# Altium schematic symbol library FPGA_Xilinx_Virtex7.SchLib: 34 symbols (part 11 of 34) (continued)
## XC7VX330T-FFG1157 (continued)
part I pins: A3 MGTHTXN3_118 (io), A4 MGTHTXP3_118 (io), B1 MGTHTXN2_118 (io), B2 MGTHTXP2_118 (io), B5 MGTHRXN3_118 (io), B6 MGTHRXP3_118 (io), C3 MGTHTXN1_118 (io), C4 MGTHTXP1_118 (io), D1 MGTHTXN0_118 (io), D2 MGTHTXP0_118 (io), D5 MGTHRXN2_118 (io), D6 MGTHRXP2_118 (io), E3 MGTHRXN1_118 (io), E4 MGTHRXP1_118 (io), F5 MGTREFCLK0N_118 (io), F6 MGTREFCLK0P_118 (io), G3 MGTHRXN0_118 (io), G4 MGTHRXP0_118 (io), H5 MGTREFCLK1N_118 (io), H6 MGTREFCLK1P_118 (io)
part J pins: AA6 MGTAVCC_G10 (power), AC2 MGTAVTT_G10 (power), AC6 MGTAVCC_G10 (power), AD3 MGTAVTT_G10 (power), AE6 MGTAVCC_G10 (power), AG2 MGTAVTT_G10 (power), AG6 MGTAVCC_G10 (power), AH3 MGTAVTT_G10 (power), AJ6 MGTAVCC_G10 (power), AL2 MGTAVTT_G10 (power), AL6 MGTAVCC_G10 (power), AM3 MGTAVTT_G10 (power), AN6 MGTAVCC_G10 (power), AN7 MGTRREF_115 (power), AP7 MGTAVTTRCAL_115 (power), C2 MGTAVTT_G11 (power), C6 MGTAVCC_G11 (power), D3 MGTAVTT_G11 (power), E6 MGTAVCC_G11 (power), G2 MGTAVTT_G11 (power), G6 MGTAVCC_G11 (power), H3 MGTAVTT_G11 (power), J6 MGTAVCC_G11 (power), L2 MGTAVTT_G11 (power), L6 MGTAVCC_G11 (power), M3 MGTAVTT_G11 (power), N6 MGTVCCAUX_G11 (power), R2 MGTAVTT_G10 (power), R6 MGTVCCAUX_G10 (power), T3 MGTAVTT_G10 (power), U6 MGTAVCC_G10 (power), W2 MGTAVTT_G10 (power), W6 MGTAVCC_G10 (power), Y3 MGTAVTT_G10 (power)
part K pins: AB8 M1_0 (io), AB9 VCCO_0 (power), AC8 M0_0 (io), L8 TDI_0 (io), M8 TCK_0 (io), N8 TDO_0 (io), N9 TMS_0 (io), T8 INIT_B_0 (io), T9 CCLK_0 (io), U8 PROGRAM_B_0 (io), U16 VN_0 (io), U17 VP_0 (io), V8 DONE_0 (io), V9 CFGBVS_0 (io), V16 VREFN_0 (io), V17 VREFP_0 (io), W8 VCCO_0 (power), W16 DXN_0 (io), W17 DXP_0 (io), Y8 M2_0 (io)
part L pins: A1 GND (power), A2 GND (power), A5 GND (power), A6 GND (power), A7 GND (power), A17 GND (power), A27 GND (power), A34 GND (power), AA10 VCCINT (power), AA12 VCCINT (power), AA14 VCCAUX_IO_G2 (power), AA16 VCCINT (power), AA18 VCCBRAM (power), AA20 VCCAUX_IO_G0 (power), AA22 VCCINT (power), AB11 VCCINT (power), AB13 VCCAUX (power), AB15 VCCINT (power), AB17 VCCBRAM (power), AB19 VCCINT (power), AB21 VCCAUX (power), AB23 VCCINT (power), AC14 VCCAUX_IO_G2 (power), AC20 VCCAUX_IO_G0 (power), B3 GND (power), B4 GND (power), B7 GND (power), B14 GND (power), B24 GND (power), C1 GND (power), C5 GND (power), C7 GND (power), C11 GND (power), C21 GND (power), C31 GND (power), D4 GND (power), D7 GND (power), D8 GND (power), D18 GND (power), D28 GND (power), E1 GND (power), E2 GND (power), E5 GND (power), E7 GND (power), E15 GND (power), E25 GND (power), F3 GND (power), F4 GND (power), F7 GND (power), F12 GND (power), F22 GND (power), F32 GND (power), G1 GND (power), G5 GND (power), G7 GND (power), G9 GND (power), G19 GND (power), G29 GND (power), H4 GND (power), H7 GND (power), H16 GND (power), H26 GND (power), J1 GND (power), J2 GND (power), J5 GND (power), J7 GND (power), J13 GND (power), J23 GND (power), J33 GND (power), K3 GND (power), K4 GND (power), K7 GND (power), K10 GND (power), K20 GND (power), K30 GND (power), L1 GND (power), L5 GND (power), L7 GND (power), L17 GND (power), L27 GND (power), M4 GND (power), M7 GND (power), M14 GND (power), M21 VCCINT (power), M22 GND (power), M23 VCCINT (power), M24 GND (power), M34 GND (power), N1 GND (power), N2 GND (power), N5 GND (power), N7 GND (power), N10 VCCINT (power), N11 GND (power), N12 VCCINT (power), N13 GND (power), N14 VCCAUX_IO_G3 (power), N15 GND (power), N16 VCCINT (power), N17 GND (power), N18 VCCBRAM (power), N19 GND (power), N20 VCCAUX_IO_G1 (power), N21 GND (power), N22 VCCINT (power), N31 GND (power), P3 GND (power), P4 GND (power), P7 GND (power), P8 GND (power), P9 VCCBATT_0 (power), P10 GND (power), P11 VCCINT (power), P12 GND (power), P13 VCCINT (power), P14 GND (power), P15 VCCINT (power), P16 GND (power), P17 VCCINT (power), P18 GND (power), P19 VCCINT (power), P20 GND (power), P21 VCCINT (power), P22 GND (power), P28 GND (power), R1 GND (power), R5 GND (power), R9 GND (power), R10 VCCINT (power), R11 GND (power), R12 VCCINT (power), R13 GND (power), R14 VCCAUX_IO_G3 (power), R15 GND (power), R16 VCCINT (power), R17 GND (power), R18 VCCBRAM (power), R20 VCCAUX_IO_G1 (power), R22 VCCINT (power), T11 VCCINT (power), T13 VCCAUX (power), T15 VCCINT (power), T16 GNDADC_0 (power), T17 VCCADC_0 (power), T19 VCCINT (power), T21 VCCAUX (power), T23 VCCINT (power), U10 VCCINT (power), U12 VCCINT (power), U14 VCCAUX_IO_G3 (power), U18 VCCBRAM (power), U20 VCCAUX_IO_G1 (power), U22 VCCINT (power), V11 VCCINT (power), V13 VCCAUX (power), V15 VCCINT (power), V19 VCCINT (power), V21 VCCAUX (power), W10 VCCINT (power), W12 VCCINT (power), W14 VCCAUX_IO_G2 (power), W18 VCCBRAM (power), W20 VCCAUX_IO_G0 (power), W22 VCCINT (power), Y9 VCCINT (power), Y11 VCCINT (power), Y13 VCCAUX (power), Y15 VCCINT (power), Y17 VCCINT (power), Y19 VCCINT (power), Y21 VCCAUX (power), Y23 VCCINT (power)
part M pins: AA1 GND (power), AA2 GND (power), AA5 GND (power), AA7 GND (power), AA8 GND (power), AA9 GND (power), AA11 GND (power), AA13 GND (power), AA15 GND (power), AA17 GND (power), AA19 GND (power), AA21 GND (power), AA27 GND (power), AB3 GND (power), AB4 GND (power), AB7 GND (power), AB10 GND (power), AB12 GND (power), AB14 GND (power), AB16 GND (power), AB18 GND (power), AB20 GND (power), AB22 GND (power), AB24 GND (power), AB34 GND (power), AC1 GND (power), AC5 GND (power), AC7 GND (power), AC11 GND (power), AC13 GND (power), AC21 GND (power), AC31 GND (power), AD4 GND (power), AD7 GND (power), AD8 GND (power), AD18 GND (power), AD28 GND (power), AE1 GND (power), AE2 GND (power), AE5 GND (power), AE7 GND (power), AE15 GND (power), AE25 GND (power), AF3 GND (power), AF4 GND (power), AF7 GND (power), AF12 GND (power), AF22 GND (power), AF32 GND (power), AG1 GND (power), AG5 GND (power), AG7 GND (power), AG9 GND (power), AG19 GND (power), AG29 GND (power), AH4 GND (power), AH7 GND (power), AH16 GND (power), AH26 GND (power), AJ1 GND (power), AJ2 GND (power), AJ5 GND (power), AJ7 GND (power), AJ13 GND (power), AJ23 GND (power), AJ33 GND (power), AK3 GND (power), AK4 GND (power), AK7 GND (power), AK10 GND (power), AK20 GND (power), AK30 GND (power), AL1 GND (power), AL5 GND (power), AL7 GND (power), AL17 GND (power), AL27 GND (power), AM4 GND (power), AM7 GND (power), AM8 GND (power), AM14 GND (power), AM24 GND (power), AM34 GND (power), AN1 GND (power), AN2 GND (power), AN5 GND (power), AN8 GND (power), AN11 GND (power), AN21 GND (power), AN31 GND (power), AP3 GND (power), AP4 GND (power), AP8 GND (power), AP18 GND (power), AP28 GND (power), R19 GND (power), R21 GND (power), R25 GND (power), T4 GND (power), T7 GND (power), T10 GND (power), T12 GND (power), T14 GND (power), T18 GND (power), T20 GND (power), T22 GND (power), T32 GND (power), U1 GND (power), U2 GND (power), U5 GND (power), U7 GND (power), U9 GND (power), U11 GND (power), U13 GND (power), U15 GND (power), U19 GND (power), U21 GND (power), U29 GND (power), V3 GND (power), V4 GND (power), V7 GND (power), V10 GND (power), V12 GND (power), V14 GND (power), V18 GND (power), V20 GND (power), V22 GND (power), V26 GND (power), W1 GND (power), W5 GND (power), W7 GND (power), W9 GND (power), W11 GND (power), W13 GND (power), W15 GND (power), W19 GND (power), W21 GND (power), W23 GND (power), W33 GND (power), Y4 GND (power), Y5 GND (power), Y6 GND (power), Y7 GND (power), Y10 GND (power), Y12 GND (power), Y14 GND (power), Y16 GND (power), Y18 GND (power), Y20 GND (power), Y22 GND (power), Y30 GND (power)

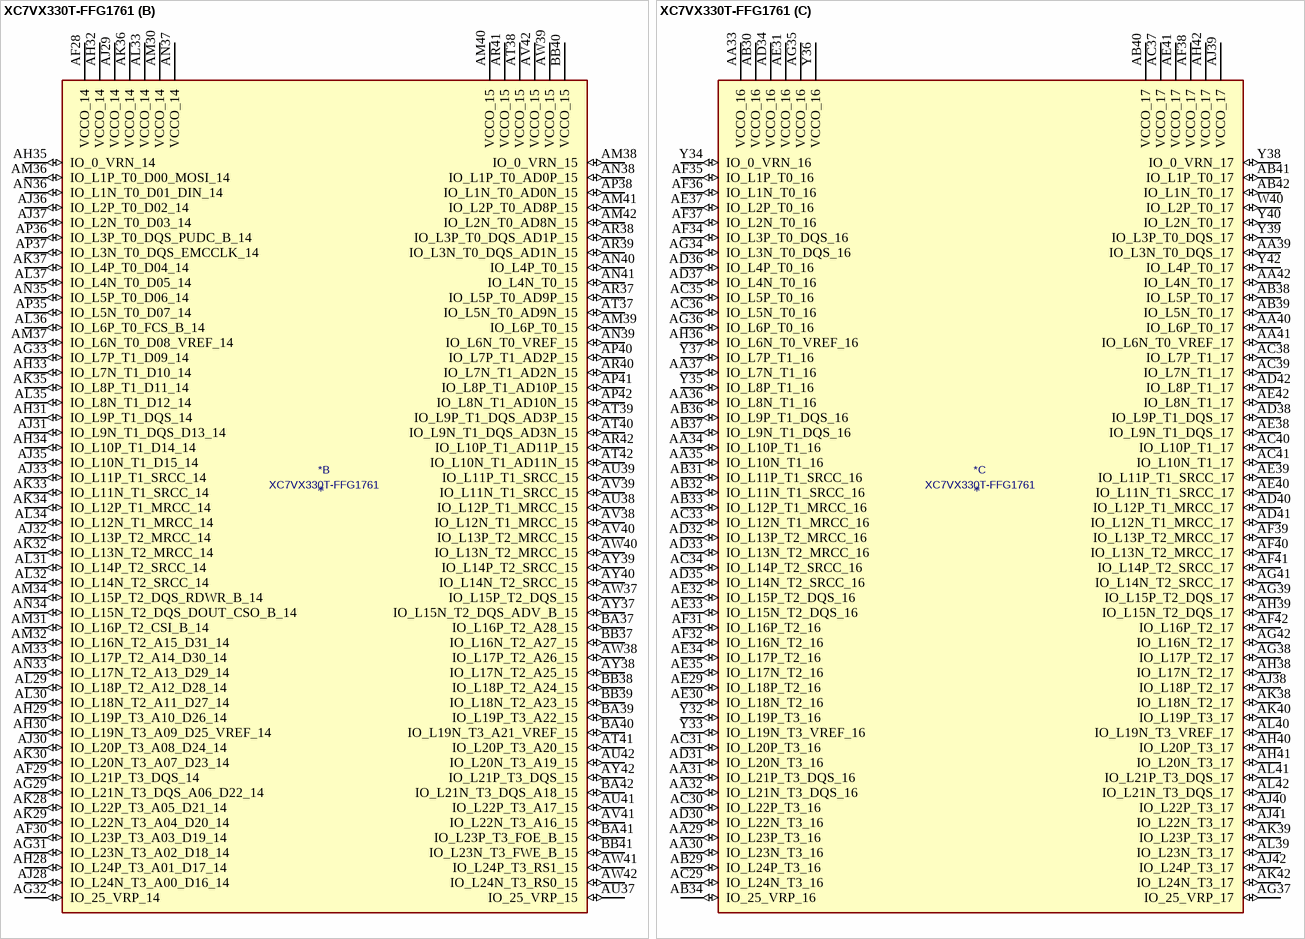
[diagram p55: symbol XC7VX330T-FFG1761]

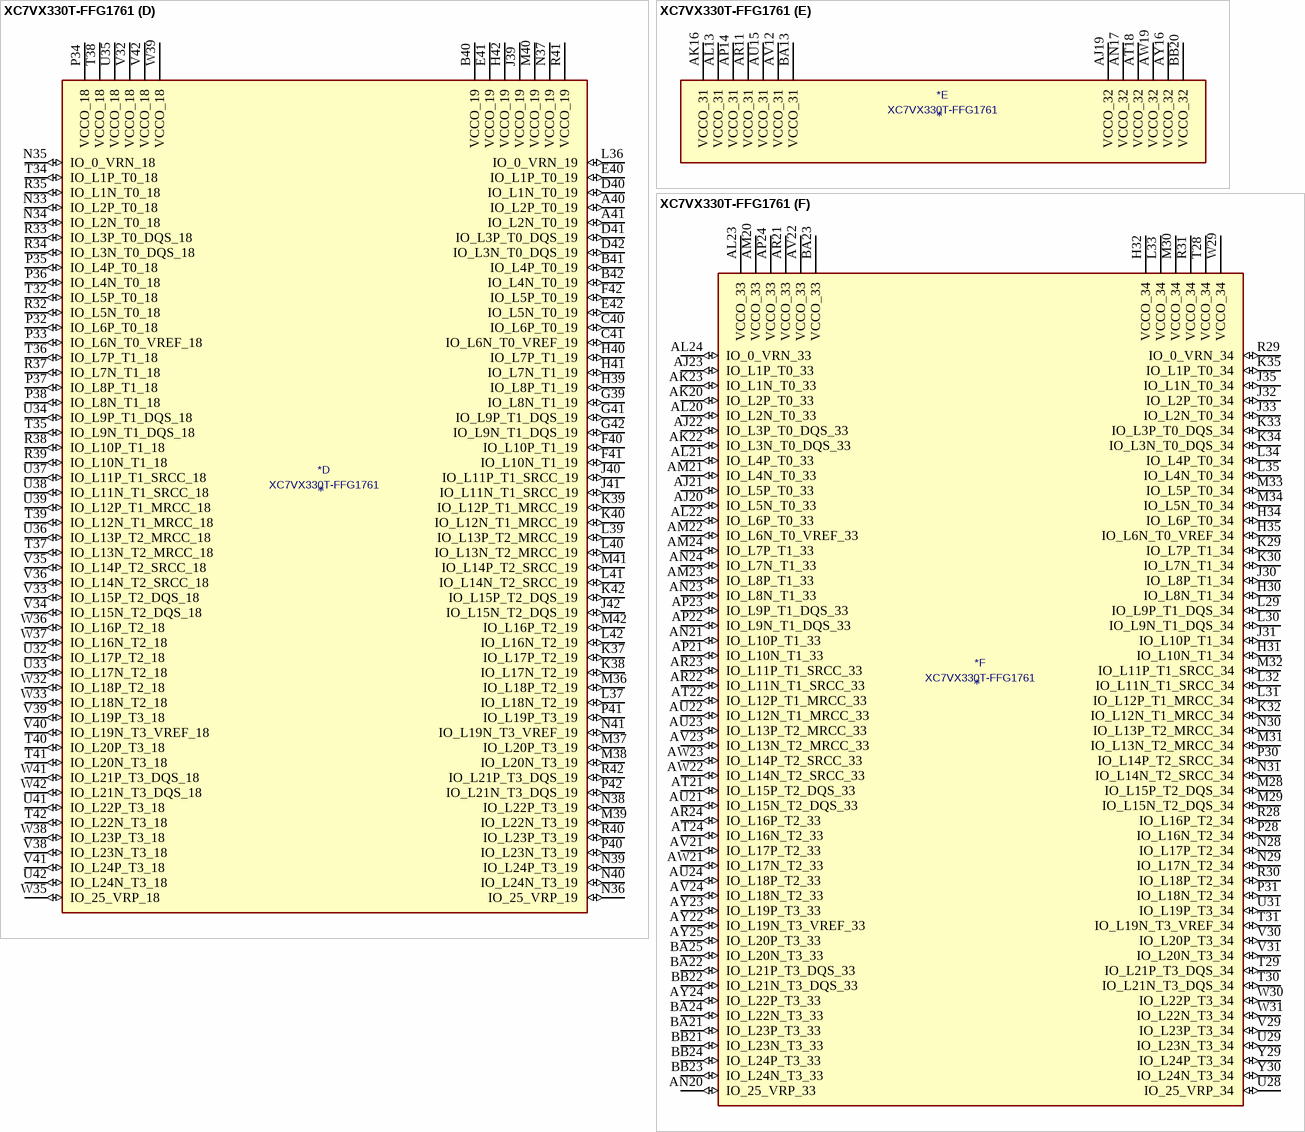
[diagram p56: symbol XC7VX330T-FFG1761]

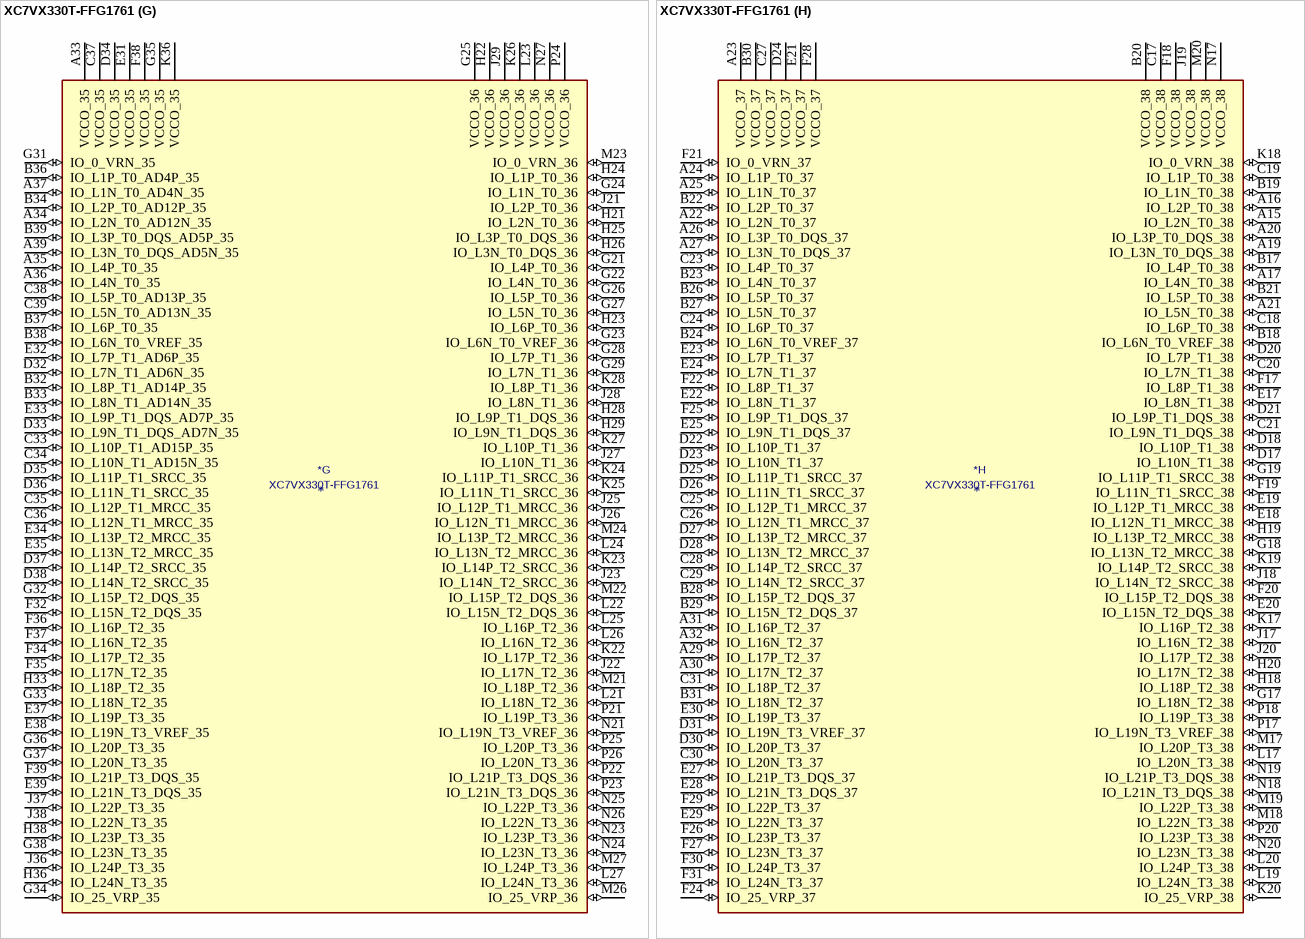
[diagram p57: symbol XC7VX330T-FFG1761]

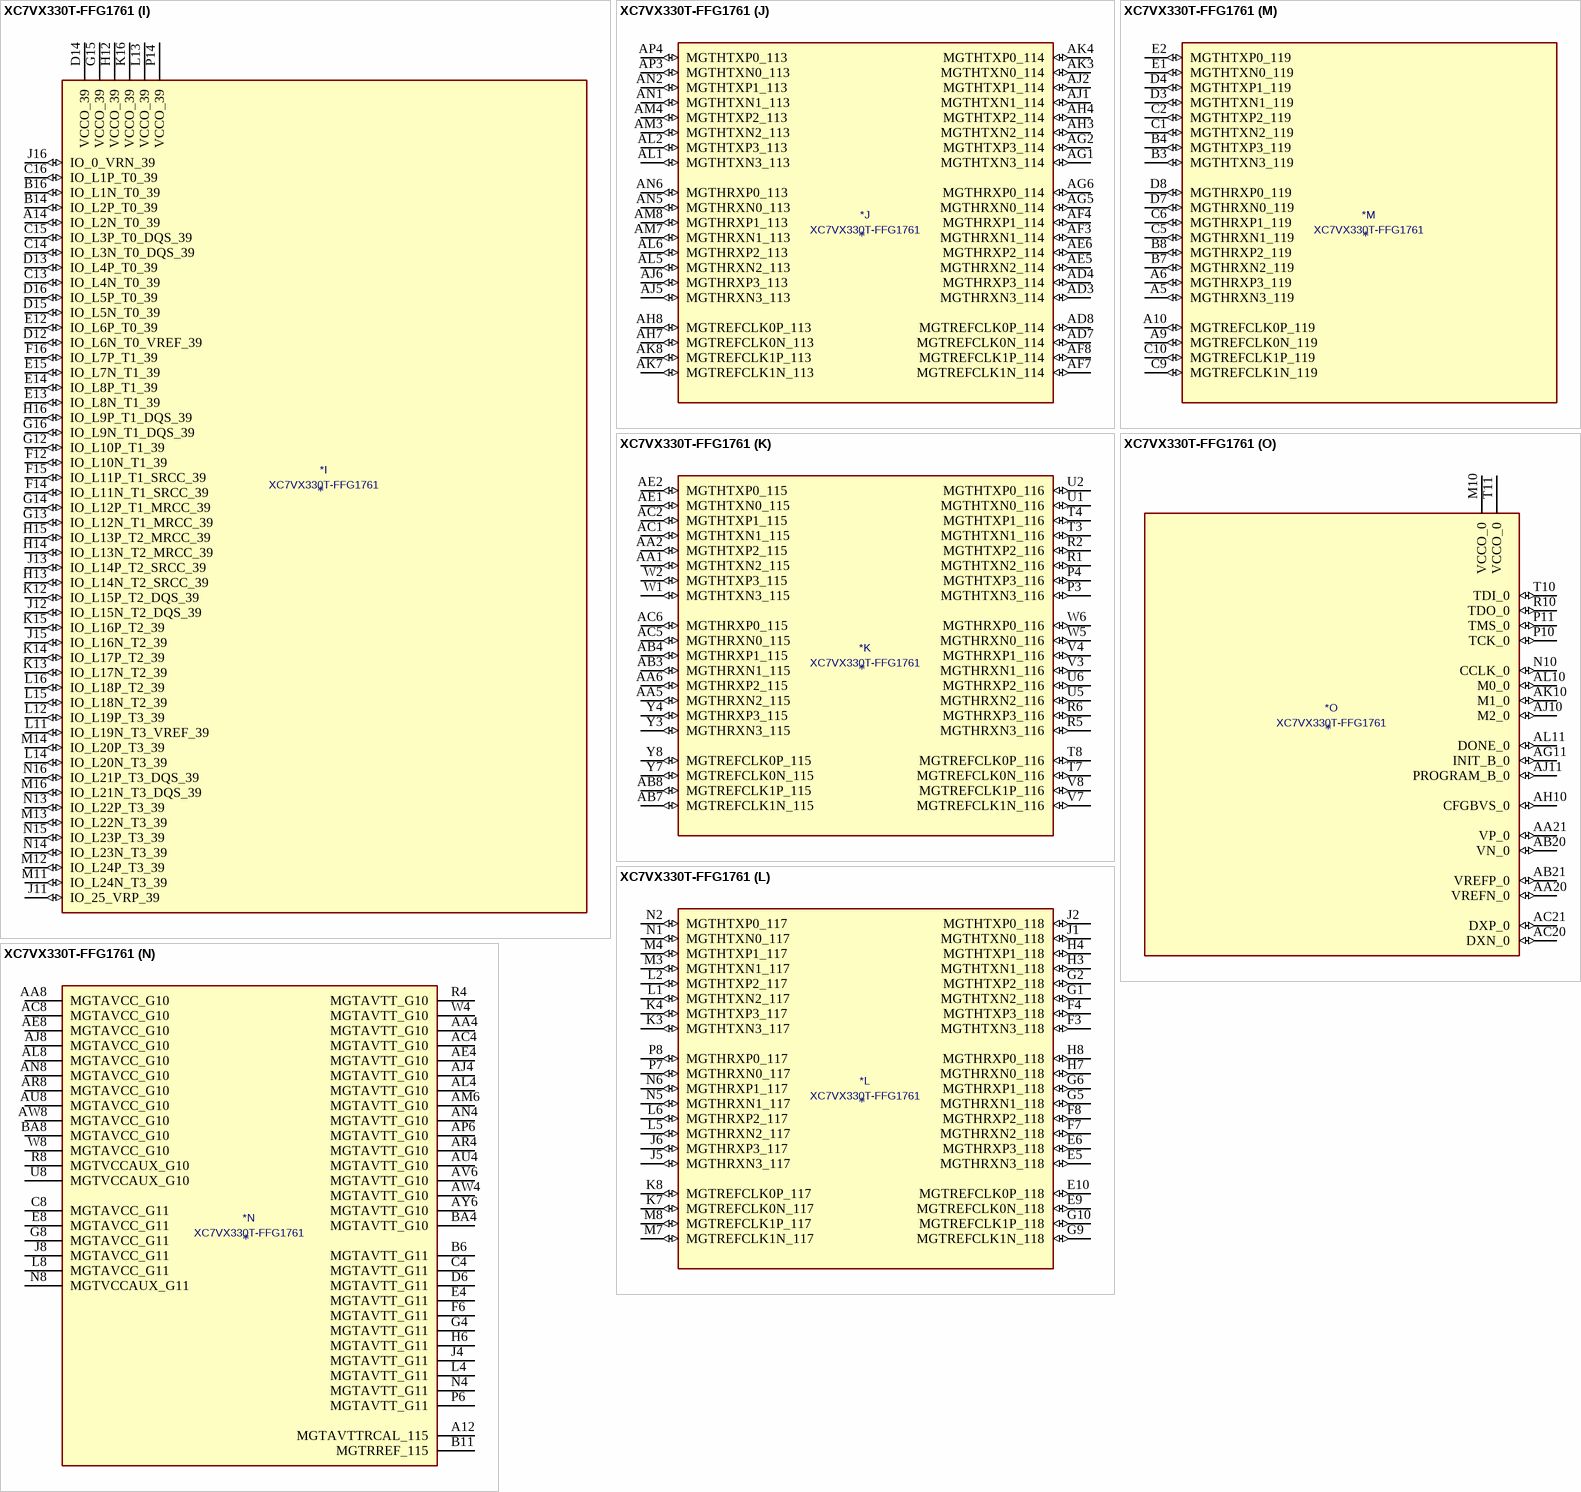
[diagram p58: symbol XC7VX330T-FFG1761]

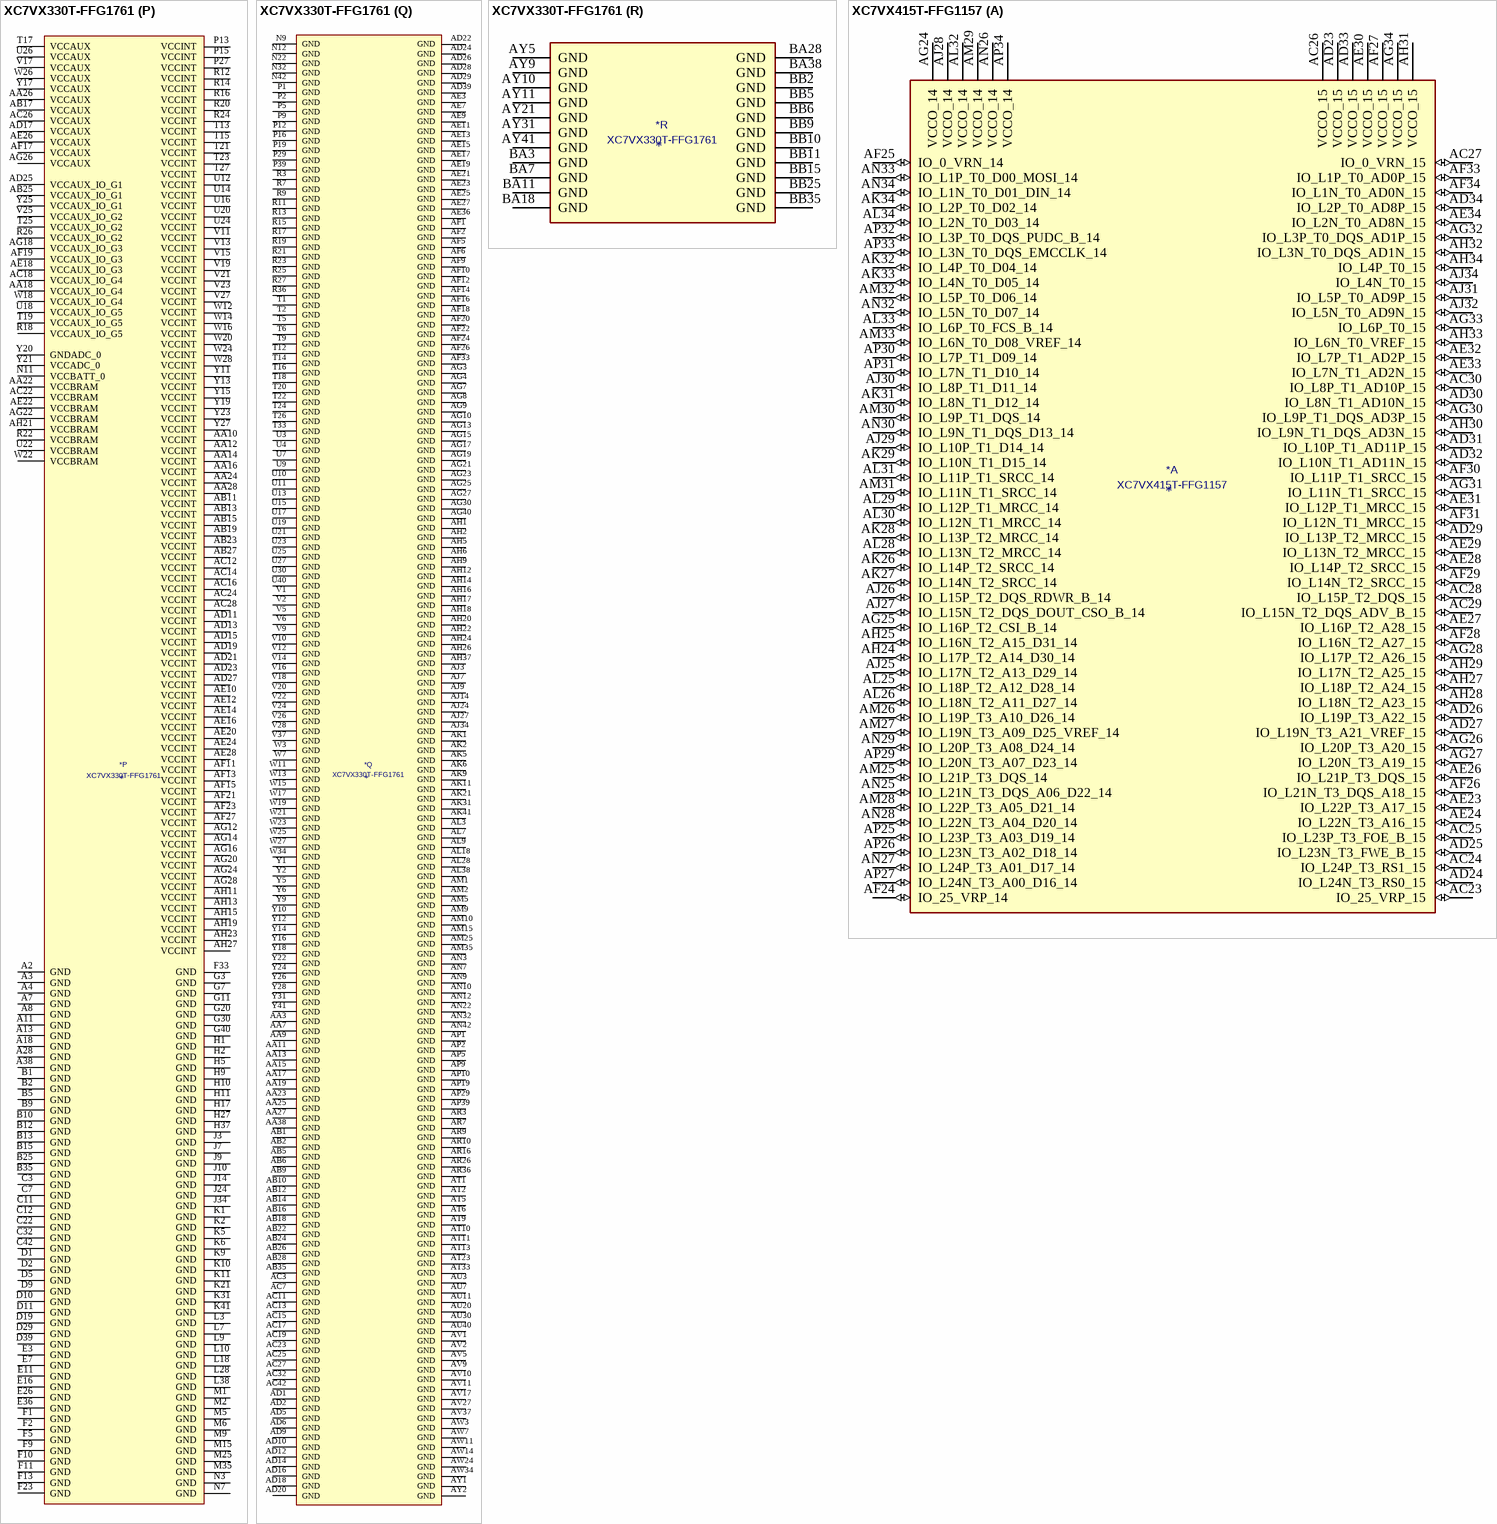
[diagram p59: symbols XC7VX330T-FFG1761 to XC7VX415T-FFG1157]